# Altium schematic symbol library Analog Devices Data Converters Digital-to-Analog Converters.SchLib: 2231 symbols (part 129 of 135)
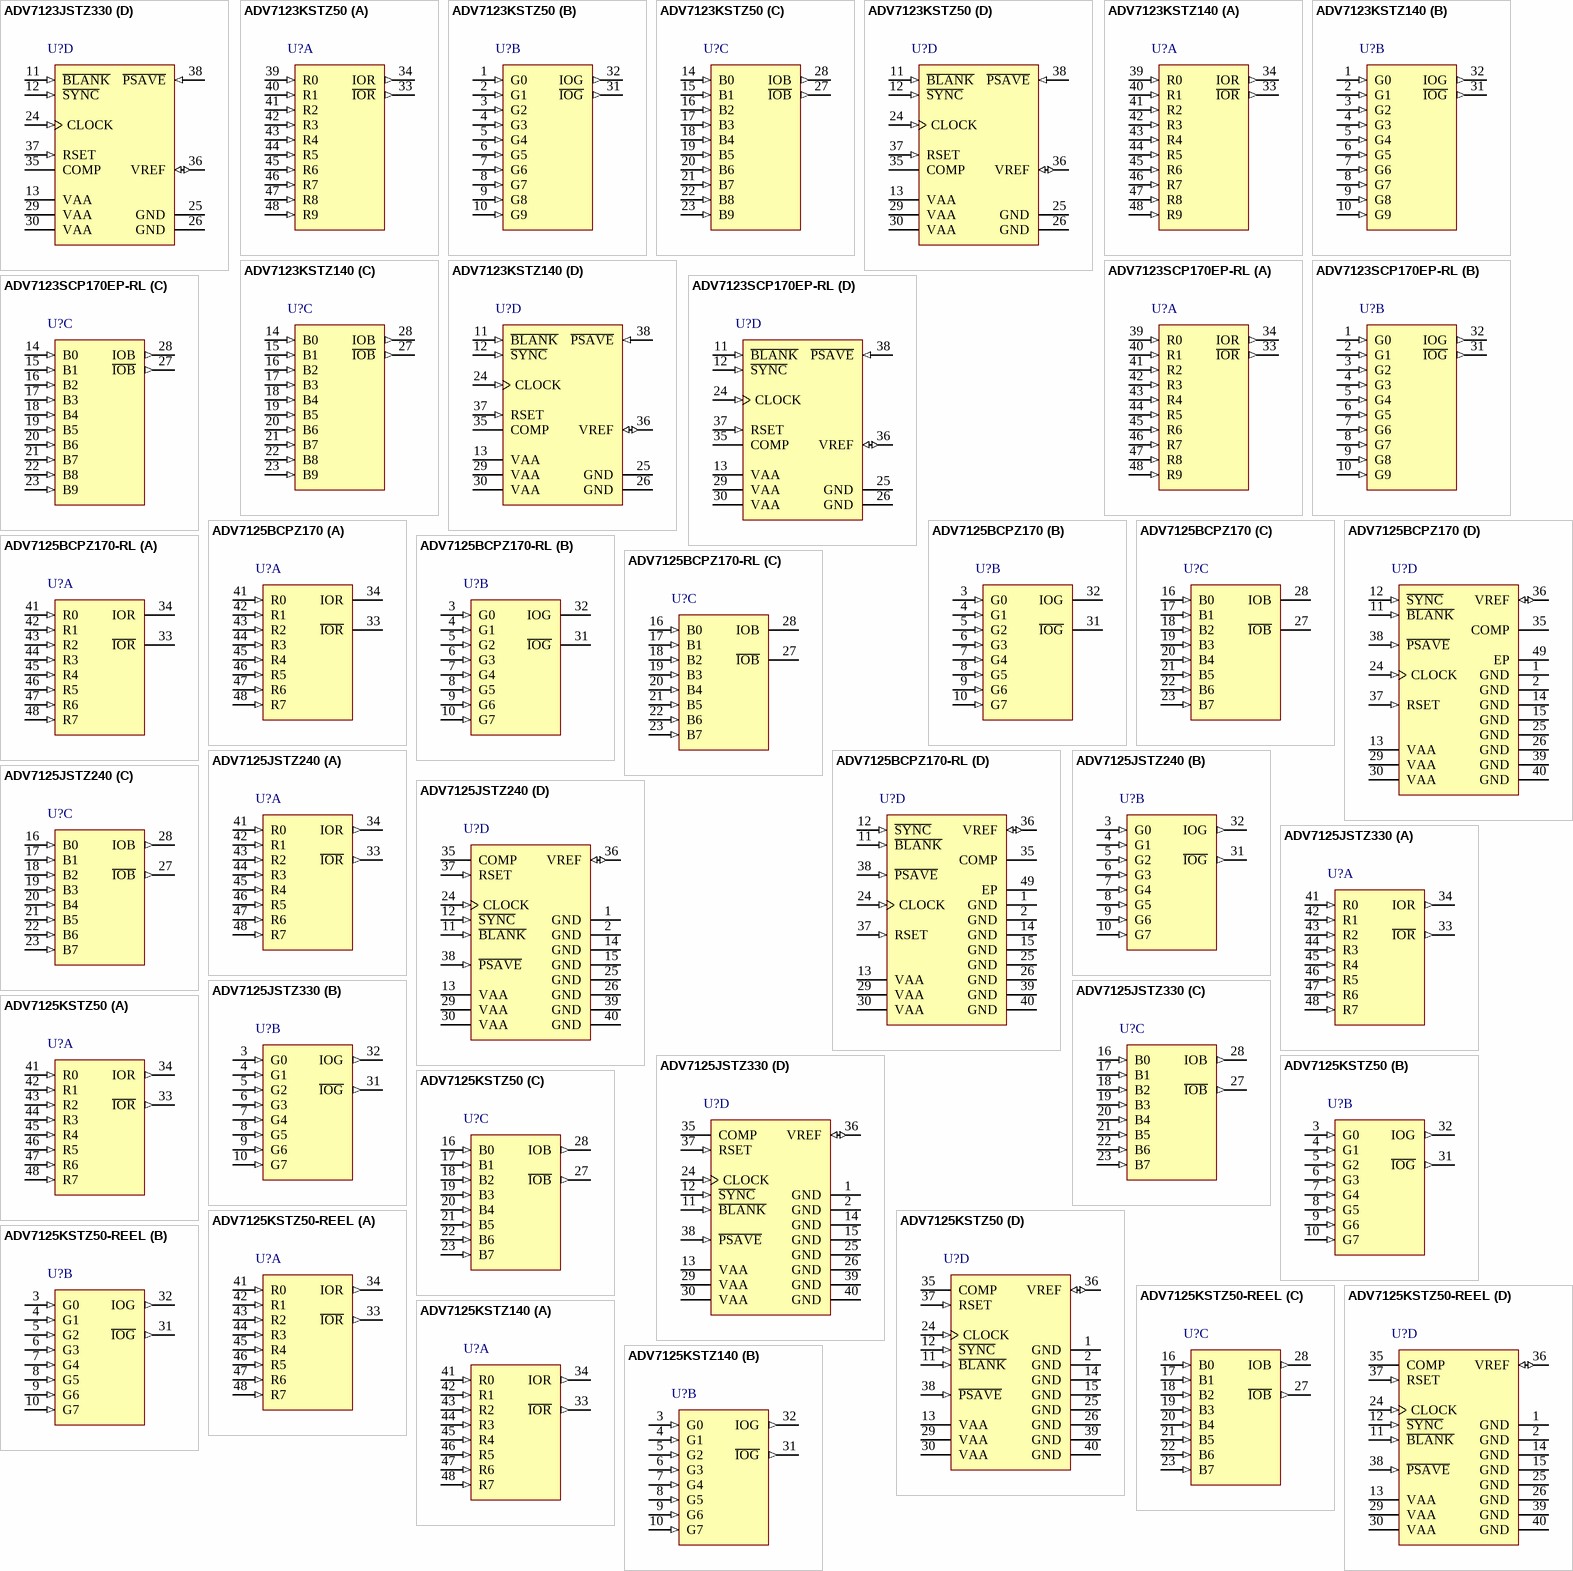
[diagram p241: symbols ADV7123JSTZ330 to ADV7125KSTZ140]

## ADV7123KSTZ50
designator U?
Triple 10-Bit CMOS 330 MHz High Speed Video Digital-to-Analog Converter, 0 to +70 degC, ST-48, Pb-Free, Tray; Generic Part Number: ADV7123; Manufacturer: Analog Devices; PartNumber: ADV7123KSTZ50; # DAC Outputs: 3; Max V+: 5.25V; Op Pwr Diss: 485mW; Resolution (Bits): 10; Settling Time: 15ns; Single Supply: Yes; DatasheetVersion: Rev.D; PackageVersion: revA; PackageReference: ST-48; PackageDescription: 48-Pin Thin Quad Flat Pack 0.5 mm Pitch; Supplier 1: Digi-Key; Supplier Part Number 1: ADV7123KSTZ50-ND; Supplier 2: Farnell; Supplier Part Number 2: 2102497; Supplier 3: Newark; Supplier Part Number 3: 94T5622; Supplier 4: Newark; Supplier Part Number 4: 19M8773; Supplier 5: Mouser; Supplier Part Number 5: 584-ADV7123KSTZ50; Packing: Tray; RoHS: Y; Mounting Technology: Surface Mount; ComponentLink1Description: Manufacturer URL; ComponentLink1URL: http://www.analog.com/en/index.html; ComponentLink2Description: Datasheet; ComponentLink2URL: http://www.analog.com/static/imported-files/data_sheets/ADV7123.pdf; ComponentLink3Description: Package Specification; ComponentLink3URL: http://www.analog.com/static/imported-files/packages/PKG_PDF/LQFP%28ST%29/ST_48.pdf; ComponentLink4Description: Product URL; ComponentLink4URL: http://www.analog.com/en/digital-to-analog-converters/da-converters/adv7123/products/product.html
footprint ST-48_N (Thin QFP, 48-Leads, Body 7x7mm, Pitch 0.5mm, IPC Medium Density)
footprint ST-48_L (Thin QFP, 48-Leads, Body 7x7mm, Pitch 0.5mm, IPC High Density)
footprint ST-48_M (Thin QFP, 48-Leads, Body 7x7mm, Pitch 0.5mm, IPC Low Density)
part A pins: 33 ~{IOR} (out) "Differential Red Current Output (High Impedance Current Sources). These RGB video outputs are specified to directly drive RS-343A and RS-170 video levels into a doubly terminated 75 ohm load. If the complementary outputs are (See Datasheet)", 34 IOR (out) "Red Current Output. These high impedance current sources are capable of directly driving a doubly terminated 75 ohm coaxial cable. All three current outputs should have similar output loads whether or not they are all being (See Datasheet)", 39 R0 (in) "Red Pixel Data Input (TTL Compatible). Pixel data is latched on the rising edge of CLOCK. R0 is the least significant data bits. Unused pixel data inputs should be connected to either the regular printed circuit board (PCB) (See Datasheet)", 40 R1 (in) "Red Pixel Data Input (TTL Compatible). Pixel data is latched on the rising edge of CLOCK. Unused pixel data inputs should be connected to either the regular printed circuit board (PCB) power or ground plane.", 41 R2 (in) "Red Pixel Data Input (TTL Compatible). Pixel data is latched on the rising edge of CLOCK. Unused pixel data inputs should be connected to either the regular printed circuit board (PCB) power or ground plane.", 42 R3 (in) "Red Pixel Data Input (TTL Compatible). Pixel data is latched on the rising edge of CLOCK. Unused pixel data inputs should be connected to either the regular printed circuit board (PCB) power or ground plane.", 43 R4 (in) "Red Pixel Data Input (TTL Compatible). Pixel data is latched on the rising edge of CLOCK. Unused pixel data inputs should be connected to either the regular printed circuit board (PCB) power or ground plane.", 44 R5 (in) "Red Pixel Data Input (TTL Compatible). Pixel data is latched on the rising edge of CLOCK. Unused pixel data inputs should be connected to either the regular printed circuit board (PCB) power or ground plane.", 45 R6 (in) "Red Pixel Data Input (TTL Compatible). Pixel data is latched on the rising edge of CLOCK. Unused pixel data inputs should be connected to either the regular printed circuit board (PCB) power or ground plane.", 46 R7 (in) "Red Pixel Data Input (TTL Compatible). Pixel data is latched on the rising edge of CLOCK. Unused pixel data inputs should be connected to either the regular printed circuit board (PCB) power or ground plane.", 47 R8 (in) "Red Pixel Data Input (TTL Compatible). Pixel data is latched on the rising edge of CLOCK. Unused pixel data inputs should be connected to either the regular printed circuit board (PCB) power or ground plane.", 48 R9 (in) "Red Pixel Data Input (TTL Compatible). Pixel data is latched on the rising edge of CLOCK. Unused pixel data inputs should be connected to either the regular printed circuit board (PCB) power or ground plane."
part B pins: 1 G0 (in) "Green Pixel Data Input (TTL Compatible). Pixel data is latched on the rising edge of CLOCK. G0 is the least significant data bits. Unused pixel data inputs should be connected to either the regular printed circuit board (See Datasheet)", 2 G1 (in) "Green Pixel Data Input (TTL Compatible). Pixel data is latched on the rising edge of CLOCK.  Unused pixel data inputs should be connected to either the regular printed circuit board (PCB) power or ground plane.", 3 G2 (in) "Green Pixel Data Input (TTL Compatible). Pixel data is latched on the rising edge of CLOCK.  Unused pixel data inputs should be connected to either the regular printed circuit board (PCB) power or ground plane.", 4 G3 (in) "Green Pixel Data Input (TTL Compatible). Pixel data is latched on the rising edge of CLOCK.  Unused pixel data inputs should be connected to either the regular printed circuit board (PCB) power or ground plane.", 5 G4 (in) "Green Pixel Data Input (TTL Compatible). Pixel data is latched on the rising edge of CLOCK.  Unused pixel data inputs should be connected to either the regular printed circuit board (PCB) power or ground plane.", 6 G5 (in) "Green Pixel Data Input (TTL Compatible). Pixel data is latched on the rising edge of CLOCK.  Unused pixel data inputs should be connected to either the regular printed circuit board (PCB) power or ground plane.", 7 G6 (in) "Green Pixel Data Input (TTL Compatible). Pixel data is latched on the rising edge of CLOCK.  Unused pixel data inputs should be connected to either the regular printed circuit board (PCB) power or ground plane.", 8 G7 (in) "Green Pixel Data Input (TTL Compatible). Pixel data is latched on the rising edge of CLOCK.  Unused pixel data inputs should be connected to either the regular printed circuit board (PCB) power or ground plane.", 9 G8 (in) "Green Pixel Data Input (TTL Compatible). Pixel data is latched on the rising edge of CLOCK.  Unused pixel data inputs should be connected to either the regular printed circuit board (PCB) power or ground plane.", 10 G9 (in) "Green Pixel Data Input (TTL Compatible). Pixel data is latched on the rising edge of CLOCK.  Unused pixel data inputs should be connected to either the regular printed circuit board (PCB) power or ground plane.", 31 ~{IOG} (out) "Differential Green Current Output (High Impedance Current Sources). These RGB video outputs are specified to directly drive RS-343A and RS-170 video levels into a doubly terminated 75 ohm load. If the complementary outputs (See Datasheet)", 32 IOG (out) "Green Current Output. These high impedance current sources are capable of directly driving a doubly terminated 75 ohm coaxial cable. All three current outputs should have similar output loads whether or not they are all (See Datasheet)"
part C pins: 14 B0 (in) "Blue Pixel Data Input (TTL Compatible). Pixel data is latched on the rising edge of CLOCK. B0 is the least significant data bits. Unused pixel data inputs should be connected to either the regular printed circuit board (PCB) (See Datasheet)", 15 B1 (in) "Blue Pixel Data Input (TTL Compatible). Pixel data is latched on the rising edge of CLOCK.  Unused pixel data inputs should be connected to either the regular printed circuit board (PCB) power or ground plane.", 16 B2 (in) "Blue Pixel Data Input (TTL Compatible). Pixel data is latched on the rising edge of CLOCK.  Unused pixel data inputs should be connected to either the regular printed circuit board (PCB) power or ground plane.", 17 B3 (in) "Blue Pixel Data Input (TTL Compatible). Pixel data is latched on the rising edge of CLOCK.  Unused pixel data inputs should be connected to either the regular printed circuit board (PCB) power or ground plane.", 18 B4 (in) "Blue Pixel Data Input (TTL Compatible). Pixel data is latched on the rising edge of CLOCK.  Unused pixel data inputs should be connected to either the regular printed circuit board (PCB) power or ground plane.", 19 B5 (in) "Blue Pixel Data Input (TTL Compatible). Pixel data is latched on the rising edge of CLOCK.  Unused pixel data inputs should be connected to either the regular printed circuit board (PCB) power or ground plane.", 20 B6 (in) "Blue Pixel Data Input (TTL Compatible). Pixel data is latched on the rising edge of CLOCK.  Unused pixel data inputs should be connected to either the regular printed circuit board (PCB) power or ground plane.", 21 B7 (in) "Blue Pixel Data Input (TTL Compatible). Pixel data is latched on the rising edge of CLOCK.  Unused pixel data inputs should be connected to either the regular printed circuit board (PCB) power or ground plane.", 22 B8 (in) "Blue Pixel Data Input (TTL Compatible). Pixel data is latched on the rising edge of CLOCK.  Unused pixel data inputs should be connected to either the regular printed circuit board (PCB) power or ground plane.", 23 B9 (in) "Blue Pixel Data Input (TTL Compatible). Pixel data is latched on the rising edge of CLOCK.  Unused pixel data inputs should be connected to either the regular printed circuit board (PCB) power or ground plane.", 27 ~{IOB} (out) "Differential Blue Current Output (High Impedance Current Sources). These RGB video outputs are specified to directly drive RS-343A and RS-170 video levels into a doubly terminated 75 ohm load. If the complementary outputs (See Datasheet)", 28 IOB (out) "Blue Current Output. These high impedance current sources are capable of directly driving a doubly terminated 75 ohm coaxial cable. All three current outputs should have similar output loads whether or not they are all being (See Datasheet)"
part D pins: 11 ~{BLANK} (in) "Composite Blank Control Input (TTL Compatible). A Logic 0 on this control input drives the analog outputs, IOR, IOB, and IOG, to the blanking level. The B\L\A\N\K\ signal is latched on the rising edge of CLOCK. While (See Datasheet)", 12 ~{SYNC} (in) "Composite Sync Control Input (TTL Compatible). A Logic 0 on the S\Y\N\C\ input switches off a 40 IRE current source. This is internally connected to the IOG analog output. S\Y\N\C\ does not override any other control or data (See Datasheet)", 13 VAA (power) "Analog Power Supply (5 V +/- 5%). All VAA pins on the ADV7123 must be connected.", 24 CLOCK (in) "Clock Input (TTL Compatible). The rising edge of CLOCK latches the R0 to R9, G0 to G9, B0 to B9, S\Y\N\C\, and B\L\A\N\K\ pixel and control inputs. It is typically the pixel clock rate of the video system. CLOCK should be (See Datasheet)", 25 GND (power) "Ground. All GND pins must be connected.", 26 GND (power) "Ground. All GND pins must be connected.", 29 VAA (power) "Analog Power Supply (5 V +/- 5%). All VAA pins on the ADV7123 must be connected.", 30 VAA (power) "Analog Power Supply (5 V +/- 5%). All VAA pins on the ADV7123 must be connected.", 35 COMP "Compensation Pin. This is a compensation pin for the internal reference amplifier. A 0.1 uF ceramic capacitor must be connected between COMP and VAA.", 36 VREF (io) "Voltage Reference Input for DACs or Voltage Reference Output (1.235 V).", 37 RSET (in) "A resistor (RSET) connected between this pin and GND controls the magnitude of the full-scale video signal. Note that the IRE relationships are maintained, regardless of the full-scale output current. For nominal video (See Datasheet)", 38 ~{PSAVE} (in) "Power Save Control Pin. Reduced power consumption is available on the ADV7123 when this pin is active."

## ADV7123KSTZ140
designator U?
3 Channel 10-Bit CMOS High Speed Video Digital-to-Analog Converter, 330 MHz, 0 to +70 degC, ST-48, Pb-Free, Tray; Generic Part Number: ADV7123; Manufacturer: Analog Devices; PartNumber: ADV7123KSTZ140; # DAC Outputs: 3; Max V+: 5.25V; Op Pwr Diss: 485mW; Resolution (Bits): 10; Settling Time: 15ns; Single Supply: Yes; DatasheetVersion: Rev.D; PackageVersion: revA; PackageReference: ST-48; PackageDescription: 48-Pin Thin Quad Flat Pack 0.5 mm Pitch; Supplier 1: Digi-Key; Supplier Part Number 1: ADV7123KSTZ140-ND; Supplier 2: Farnell; Supplier Part Number 2: 2102496; Supplier 3: Newark; Supplier Part Number 3: 94T5621; Supplier 4: Newark; Supplier Part Number 4: 19M8772; Supplier 5: Mouser; Supplier Part Number 5: 584-ADV7123KSTZ140; Packing: Tray; RoHS: Y; Mounting Technology: Surface Mount; ComponentLink1Description: Manufacturer URL; ComponentLink1URL: http://www.analog.com/en/index.html; ComponentLink2Description: Datasheet; ComponentLink2URL: http://www.analog.com/static/imported-files/data_sheets/ADV7123.pdf; ComponentLink3Description: Package Specification; ComponentLink3URL: http://www.analog.com/static/imported-files/packages/PKG_PDF/LQFP%28ST%29/ST_48.pdf; ComponentLink4Description: Product URL; ComponentLink4URL: http://www.analog.com/en/digital-to-analog-converters/da-converters/adv7123/products/product.html
footprint ST-48_N (Thin QFP, 48-Leads, Body 7x7mm, Pitch 0.5mm, IPC Medium Density)
footprint ST-48_L (Thin QFP, 48-Leads, Body 7x7mm, Pitch 0.5mm, IPC High Density)
footprint ST-48_M (Thin QFP, 48-Leads, Body 7x7mm, Pitch 0.5mm, IPC Low Density)
part A pins: 33 ~{IOR} (out) "Differential Red Current Output (High Impedance Current Sources). These RGB video outputs are specified to directly drive RS-343A and RS-170 video levels into a doubly terminated 75 ohm load. If the complementary outputs are (See Datasheet)", 34 IOR (out) "Red Current Output. These high impedance current sources are capable of directly driving a doubly terminated 75 ohm coaxial cable. All three current outputs should have similar output loads whether or not they are all being (See Datasheet)", 39 R0 (in) "Red Pixel Data Input (TTL Compatible). Pixel data is latched on the rising edge of CLOCK. R0 is the least significant data bits. Unused pixel data inputs should be connected to either the regular printed circuit board (PCB) (See Datasheet)", 40 R1 (in) "Red Pixel Data Input (TTL Compatible). Pixel data is latched on the rising edge of CLOCK. Unused pixel data inputs should be connected to either the regular printed circuit board (PCB) power or ground plane.", 41 R2 (in) "Red Pixel Data Input (TTL Compatible). Pixel data is latched on the rising edge of CLOCK. Unused pixel data inputs should be connected to either the regular printed circuit board (PCB) power or ground plane.", 42 R3 (in) "Red Pixel Data Input (TTL Compatible). Pixel data is latched on the rising edge of CLOCK. Unused pixel data inputs should be connected to either the regular printed circuit board (PCB) power or ground plane.", 43 R4 (in) "Red Pixel Data Input (TTL Compatible). Pixel data is latched on the rising edge of CLOCK. Unused pixel data inputs should be connected to either the regular printed circuit board (PCB) power or ground plane.", 44 R5 (in) "Red Pixel Data Input (TTL Compatible). Pixel data is latched on the rising edge of CLOCK. Unused pixel data inputs should be connected to either the regular printed circuit board (PCB) power or ground plane.", 45 R6 (in) "Red Pixel Data Input (TTL Compatible). Pixel data is latched on the rising edge of CLOCK. Unused pixel data inputs should be connected to either the regular printed circuit board (PCB) power or ground plane.", 46 R7 (in) "Red Pixel Data Input (TTL Compatible). Pixel data is latched on the rising edge of CLOCK. Unused pixel data inputs should be connected to either the regular printed circuit board (PCB) power or ground plane.", 47 R8 (in) "Red Pixel Data Input (TTL Compatible). Pixel data is latched on the rising edge of CLOCK. Unused pixel data inputs should be connected to either the regular printed circuit board (PCB) power or ground plane.", 48 R9 (in) "Red Pixel Data Input (TTL Compatible). Pixel data is latched on the rising edge of CLOCK. Unused pixel data inputs should be connected to either the regular printed circuit board (PCB) power or ground plane."
part B pins: 1 G0 (in) "Green Pixel Data Input (TTL Compatible). Pixel data is latched on the rising edge of CLOCK. G0 is the least significant data bits. Unused pixel data inputs should be connected to either the regular printed circuit board (See Datasheet)", 2 G1 (in) "Green Pixel Data Input (TTL Compatible). Pixel data is latched on the rising edge of CLOCK.  Unused pixel data inputs should be connected to either the regular printed circuit board (PCB) power or ground plane.", 3 G2 (in) "Green Pixel Data Input (TTL Compatible). Pixel data is latched on the rising edge of CLOCK.  Unused pixel data inputs should be connected to either the regular printed circuit board (PCB) power or ground plane.", 4 G3 (in) "Green Pixel Data Input (TTL Compatible). Pixel data is latched on the rising edge of CLOCK.  Unused pixel data inputs should be connected to either the regular printed circuit board (PCB) power or ground plane.", 5 G4 (in) "Green Pixel Data Input (TTL Compatible). Pixel data is latched on the rising edge of CLOCK.  Unused pixel data inputs should be connected to either the regular printed circuit board (PCB) power or ground plane.", 6 G5 (in) "Green Pixel Data Input (TTL Compatible). Pixel data is latched on the rising edge of CLOCK.  Unused pixel data inputs should be connected to either the regular printed circuit board (PCB) power or ground plane.", 7 G6 (in) "Green Pixel Data Input (TTL Compatible). Pixel data is latched on the rising edge of CLOCK.  Unused pixel data inputs should be connected to either the regular printed circuit board (PCB) power or ground plane.", 8 G7 (in) "Green Pixel Data Input (TTL Compatible). Pixel data is latched on the rising edge of CLOCK.  Unused pixel data inputs should be connected to either the regular printed circuit board (PCB) power or ground plane.", 9 G8 (in) "Green Pixel Data Input (TTL Compatible). Pixel data is latched on the rising edge of CLOCK.  Unused pixel data inputs should be connected to either the regular printed circuit board (PCB) power or ground plane.", 10 G9 (in) "Green Pixel Data Input (TTL Compatible). Pixel data is latched on the rising edge of CLOCK.  Unused pixel data inputs should be connected to either the regular printed circuit board (PCB) power or ground plane.", 31 ~{IOG} (out) "Differential Green Current Output (High Impedance Current Sources). These RGB video outputs are specified to directly drive RS-343A and RS-170 video levels into a doubly terminated 75 ohm load. If the complementary outputs (See Datasheet)", 32 IOG (out) "Green Current Output. These high impedance current sources are capable of directly driving a doubly terminated 75 ohm coaxial cable. All three current outputs should have similar output loads whether or not they are all (See Datasheet)"
part C pins: 14 B0 (in) "Blue Pixel Data Input (TTL Compatible). Pixel data is latched on the rising edge of CLOCK. B0 is the least significant data bits. Unused pixel data inputs should be connected to either the regular printed circuit board (PCB) (See Datasheet)", 15 B1 (in) "Blue Pixel Data Input (TTL Compatible). Pixel data is latched on the rising edge of CLOCK.  Unused pixel data inputs should be connected to either the regular printed circuit board (PCB) power or ground plane.", 16 B2 (in) "Blue Pixel Data Input (TTL Compatible). Pixel data is latched on the rising edge of CLOCK.  Unused pixel data inputs should be connected to either the regular printed circuit board (PCB) power or ground plane.", 17 B3 (in) "Blue Pixel Data Input (TTL Compatible). Pixel data is latched on the rising edge of CLOCK.  Unused pixel data inputs should be connected to either the regular printed circuit board (PCB) power or ground plane.", 18 B4 (in) "Blue Pixel Data Input (TTL Compatible). Pixel data is latched on the rising edge of CLOCK.  Unused pixel data inputs should be connected to either the regular printed circuit board (PCB) power or ground plane.", 19 B5 (in) "Blue Pixel Data Input (TTL Compatible). Pixel data is latched on the rising edge of CLOCK.  Unused pixel data inputs should be connected to either the regular printed circuit board (PCB) power or ground plane.", 20 B6 (in) "Blue Pixel Data Input (TTL Compatible). Pixel data is latched on the rising edge of CLOCK.  Unused pixel data inputs should be connected to either the regular printed circuit board (PCB) power or ground plane.", 21 B7 (in) "Blue Pixel Data Input (TTL Compatible). Pixel data is latched on the rising edge of CLOCK.  Unused pixel data inputs should be connected to either the regular printed circuit board (PCB) power or ground plane.", 22 B8 (in) "Blue Pixel Data Input (TTL Compatible). Pixel data is latched on the rising edge of CLOCK.  Unused pixel data inputs should be connected to either the regular printed circuit board (PCB) power or ground plane.", 23 B9 (in) "Blue Pixel Data Input (TTL Compatible). Pixel data is latched on the rising edge of CLOCK.  Unused pixel data inputs should be connected to either the regular printed circuit board (PCB) power or ground plane.", 27 ~{IOB} (out) "Differential Blue Current Output (High Impedance Current Sources). These RGB video outputs are specified to directly drive RS-343A and RS-170 video levels into a doubly terminated 75 ohm load. If the complementary outputs (See Datasheet)", 28 IOB (out) "Blue Current Output. These high impedance current sources are capable of directly driving a doubly terminated 75 ohm coaxial cable. All three current outputs should have similar output loads whether or not they are all being (See Datasheet)"
part D pins: 11 ~{BLANK} (in) "Composite Blank Control Input (TTL Compatible). A Logic 0 on this control input drives the analog outputs, IOR, IOB, and IOG, to the blanking level. The B\L\A\N\K\ signal is latched on the rising edge of CLOCK. While (See Datasheet)", 12 ~{SYNC} (in) "Composite Sync Control Input (TTL Compatible). A Logic 0 on the S\Y\N\C\ input switches off a 40 IRE current source. This is internally connected to the IOG analog output. S\Y\N\C\ does not override any other control or data (See Datasheet)", 13 VAA (power) "Analog Power Supply (5 V +/- 5%). All VAA pins on the ADV7123 must be connected.", 24 CLOCK (in) "Clock Input (TTL Compatible). The rising edge of CLOCK latches the R0 to R9, G0 to G9, B0 to B9, S\Y\N\C\, and B\L\A\N\K\ pixel and control inputs. It is typically the pixel clock rate of the video system. CLOCK should be (See Datasheet)", 25 GND (power) "Ground. All GND pins must be connected.", 26 GND (power) "Ground. All GND pins must be connected.", 29 VAA (power) "Analog Power Supply (5 V +/- 5%). All VAA pins on the ADV7123 must be connected.", 30 VAA (power) "Analog Power Supply (5 V +/- 5%). All VAA pins on the ADV7123 must be connected.", 35 COMP "Compensation Pin. This is a compensation pin for the internal reference amplifier. A 0.1 uF ceramic capacitor must be connected between COMP and VAA.", 36 VREF (io) "Voltage Reference Input for DACs or Voltage Reference Output (1.235 V).", 37 RSET (in) "A resistor (RSET) connected between this pin and GND controls the magnitude of the full-scale video signal. Note that the IRE relationships are maintained, regardless of the full-scale output current. For nominal video (See Datasheet)", 38 ~{PSAVE} (in) "Power Save Control Pin. Reduced power consumption is available on the ADV7123 when this pin is active."

## ADV7123SCP170EP-RL
designator U?
3 Channel 10-Bit CMOS High Speed Video Digital-to-Analog Converter, 170 MHz, -55 to +125 degC, ST-48, Reel; Generic Part Number: ADV7123; Manufacturer: Analog Devices; PartNumber: ADV7123SCP170EP-RL; # DAC Outputs: 3; Max V+: 5.25V; Op Pwr Diss: 485mW; Resolution (Bits): 10; Settling Time: 15ns; Single Supply: Yes; DatasheetVersion: Rev.0; PackageVersion: revA; PackageReference: ST-48; PackageDescription: 48-Pin Thin Quad Flat Pack 0.5 mm Pitch; Supplier 1: Digi-Key; Supplier Part Number 1: ADV7123SCP170EP-RLTR-ND; Supplier 2: Digi-Key; Supplier Part Number 2: ADV7123SCP170EP-RLCT-ND; Supplier 3: Digi-Key; Supplier Part Number 3: ADV7123SCP170EP-RLDKR-ND; Supplier 4: Newark; Supplier Part Number 4: 83R9348; Supplier 5: Mouser; Supplier Part Number 5: 584-ADV7123SCP170EPR; Packing: Reel; RoHS: N; Mounting Technology: Surface Mount; ComponentLink1Description: Manufacturer URL; ComponentLink1URL: http://www.analog.com/en/index.html; ComponentLink2Description: Datasheet; ComponentLink2URL: http://www.analog.com/static/imported-files/data_sheets/ADV7123-EP.pdf; ComponentLink3Description: Package Specification; ComponentLink3URL: http://www.analog.com/static/imported-files/packages/PKG_PDF/LQFP%28ST%29/ST_48.pdf; ComponentLink4Description: Product URL; ComponentLink4URL: http://www.analog.com/en/digital-to-analog-converters/da-converters/adv7123/products/product.html
footprint ST-48_N (Thin QFP, 48-Leads, Body 7x7mm, Pitch 0.5mm, IPC Medium Density)
footprint ST-48_L (Thin QFP, 48-Leads, Body 7x7mm, Pitch 0.5mm, IPC High Density)
footprint ST-48_M (Thin QFP, 48-Leads, Body 7x7mm, Pitch 0.5mm, IPC Low Density)
part A pins: 33 ~{IOR} (out) "Differential Red Current Output (High Impedance Current Sources). These RGB video outputs are specified to directly drive RS-343A and RS-170 video levels into a doubly terminated 75 ohm load. If the complementary outputs are (See Datasheet)", 34 IOR (out) "Red Current Output. These high impedance current sources are capable of directly driving a doubly terminated 75 ohm coaxial cable. All three current outputs should have similar output loads whether or not they are all being (See Datasheet)", 39 R0 (in) "Red Pixel Data Input (TTL Compatible). Pixel data is latched on the rising edge of CLOCK. R0 is the least significant data bits. Unused pixel data inputs should be connected to either the regular printed circuit board (PCB) (See Datasheet)", 40 R1 (in) "Red Pixel Data Input (TTL Compatible). Pixel data is latched on the rising edge of CLOCK. Unused pixel data inputs should be connected to either the regular printed circuit board (PCB) power or ground plane.", 41 R2 (in) "Red Pixel Data Input (TTL Compatible). Pixel data is latched on the rising edge of CLOCK. Unused pixel data inputs should be connected to either the regular printed circuit board (PCB) power or ground plane.", 42 R3 (in) "Red Pixel Data Input (TTL Compatible). Pixel data is latched on the rising edge of CLOCK. Unused pixel data inputs should be connected to either the regular printed circuit board (PCB) power or ground plane.", 43 R4 (in) "Red Pixel Data Input (TTL Compatible). Pixel data is latched on the rising edge of CLOCK. Unused pixel data inputs should be connected to either the regular printed circuit board (PCB) power or ground plane.", 44 R5 (in) "Red Pixel Data Input (TTL Compatible). Pixel data is latched on the rising edge of CLOCK. Unused pixel data inputs should be connected to either the regular printed circuit board (PCB) power or ground plane.", 45 R6 (in) "Red Pixel Data Input (TTL Compatible). Pixel data is latched on the rising edge of CLOCK. Unused pixel data inputs should be connected to either the regular printed circuit board (PCB) power or ground plane.", 46 R7 (in) "Red Pixel Data Input (TTL Compatible). Pixel data is latched on the rising edge of CLOCK. Unused pixel data inputs should be connected to either the regular printed circuit board (PCB) power or ground plane.", 47 R8 (in) "Red Pixel Data Input (TTL Compatible). Pixel data is latched on the rising edge of CLOCK. Unused pixel data inputs should be connected to either the regular printed circuit board (PCB) power or ground plane.", 48 R9 (in) "Red Pixel Data Input (TTL Compatible). Pixel data is latched on the rising edge of CLOCK. Unused pixel data inputs should be connected to either the regular printed circuit board (PCB) power or ground plane."
part B pins: 1 G0 (in) "Green Pixel Data Input (TTL Compatible). Pixel data is latched on the rising edge of CLOCK. G0 is the least significant data bits. Unused pixel data inputs should be connected to either the regular printed circuit board (See Datasheet)", 2 G1 (in) "Green Pixel Data Input (TTL Compatible). Pixel data is latched on the rising edge of CLOCK.  Unused pixel data inputs should be connected to either the regular printed circuit board (PCB) power or ground plane.", 3 G2 (in) "Green Pixel Data Input (TTL Compatible). Pixel data is latched on the rising edge of CLOCK.  Unused pixel data inputs should be connected to either the regular printed circuit board (PCB) power or ground plane.", 4 G3 (in) "Green Pixel Data Input (TTL Compatible). Pixel data is latched on the rising edge of CLOCK.  Unused pixel data inputs should be connected to either the regular printed circuit board (PCB) power or ground plane.", 5 G4 (in) "Green Pixel Data Input (TTL Compatible). Pixel data is latched on the rising edge of CLOCK.  Unused pixel data inputs should be connected to either the regular printed circuit board (PCB) power or ground plane.", 6 G5 (in) "Green Pixel Data Input (TTL Compatible). Pixel data is latched on the rising edge of CLOCK.  Unused pixel data inputs should be connected to either the regular printed circuit board (PCB) power or ground plane.", 7 G6 (in) "Green Pixel Data Input (TTL Compatible). Pixel data is latched on the rising edge of CLOCK.  Unused pixel data inputs should be connected to either the regular printed circuit board (PCB) power or ground plane.", 8 G7 (in) "Green Pixel Data Input (TTL Compatible). Pixel data is latched on the rising edge of CLOCK.  Unused pixel data inputs should be connected to either the regular printed circuit board (PCB) power or ground plane.", 9 G8 (in) "Green Pixel Data Input (TTL Compatible). Pixel data is latched on the rising edge of CLOCK.  Unused pixel data inputs should be connected to either the regular printed circuit board (PCB) power or ground plane.", 10 G9 (in) "Green Pixel Data Input (TTL Compatible). Pixel data is latched on the rising edge of CLOCK.  Unused pixel data inputs should be connected to either the regular printed circuit board (PCB) power or ground plane.", 31 ~{IOG} (out) "Differential Green Current Output (High Impedance Current Sources). These RGB video outputs are specified to directly drive RS-343A and RS-170 video levels into a doubly terminated 75 ohm load. If the complementary outputs (See Datasheet)", 32 IOG (out) "Green Current Output. These high impedance current sources are capable of directly driving a doubly terminated 75 ohm coaxial cable. All three current outputs should have similar output loads whether or not they are all (See Datasheet)"
part C pins: 14 B0 (in) "Blue Pixel Data Input (TTL Compatible). Pixel data is latched on the rising edge of CLOCK. B0 is the least significant data bits. Unused pixel data inputs should be connected to either the regular printed circuit board (PCB) (See Datasheet)", 15 B1 (in) "Blue Pixel Data Input (TTL Compatible). Pixel data is latched on the rising edge of CLOCK.  Unused pixel data inputs should be connected to either the regular printed circuit board (PCB) power or ground plane.", 16 B2 (in) "Blue Pixel Data Input (TTL Compatible). Pixel data is latched on the rising edge of CLOCK.  Unused pixel data inputs should be connected to either the regular printed circuit board (PCB) power or ground plane.", 17 B3 (in) "Blue Pixel Data Input (TTL Compatible). Pixel data is latched on the rising edge of CLOCK.  Unused pixel data inputs should be connected to either the regular printed circuit board (PCB) power or ground plane.", 18 B4 (in) "Blue Pixel Data Input (TTL Compatible). Pixel data is latched on the rising edge of CLOCK.  Unused pixel data inputs should be connected to either the regular printed circuit board (PCB) power or ground plane.", 19 B5 (in) "Blue Pixel Data Input (TTL Compatible). Pixel data is latched on the rising edge of CLOCK.  Unused pixel data inputs should be connected to either the regular printed circuit board (PCB) power or ground plane.", 20 B6 (in) "Blue Pixel Data Input (TTL Compatible). Pixel data is latched on the rising edge of CLOCK.  Unused pixel data inputs should be connected to either the regular printed circuit board (PCB) power or ground plane.", 21 B7 (in) "Blue Pixel Data Input (TTL Compatible). Pixel data is latched on the rising edge of CLOCK.  Unused pixel data inputs should be connected to either the regular printed circuit board (PCB) power or ground plane.", 22 B8 (in) "Blue Pixel Data Input (TTL Compatible). Pixel data is latched on the rising edge of CLOCK.  Unused pixel data inputs should be connected to either the regular printed circuit board (PCB) power or ground plane.", 23 B9 (in) "Blue Pixel Data Input (TTL Compatible). Pixel data is latched on the rising edge of CLOCK.  Unused pixel data inputs should be connected to either the regular printed circuit board (PCB) power or ground plane.", 27 ~{IOB} (out) "Differential Blue Current Output (High Impedance Current Sources). These RGB video outputs are specified to directly drive RS-343A and RS-170 video levels into a doubly terminated 75 ohm load. If the complementary outputs (See Datasheet)", 28 IOB (out) "Blue Current Output. These high impedance current sources are capable of directly driving a doubly terminated 75 ohm coaxial cable. All three current outputs should have similar output loads whether or not they are all being (See Datasheet)"
part D pins: 11 ~{BLANK} (in) "Composite Blank Control Input (TTL Compatible). A Logic 0 on this control input drives the analog outputs, IOR, IOB, and IOG, to the blanking level. The B\L\A\N\K\ signal is latched on the rising edge of CLOCK. While (See Datasheet)", 12 ~{SYNC} (in) "Composite Sync Control Input (TTL Compatible). A Logic 0 on the S\Y\N\C\ input switches off a 40 IRE current source. This is internally connected to the IOG analog output. S\Y\N\C\ does not override any other control or data (See Datasheet)", 13 VAA (power) "Analog Power Supply (5 V +/- 5%). All VAA pins on the ADV7123 must be connected.", 24 CLOCK (in) "Clock Input (TTL Compatible). The rising edge of CLOCK latches the R0 to R9, G0 to G9, B0 to B9, S\Y\N\C\, and B\L\A\N\K\ pixel and control inputs. It is typically the pixel clock rate of the video system. CLOCK should be (See Datasheet)", 25 GND (power) "Ground. All GND pins must be connected.", 26 GND (power) "Ground. All GND pins must be connected.", 29 VAA (power) "Analog Power Supply (5 V +/- 5%). All VAA pins on the ADV7123 must be connected.", 30 VAA (power) "Analog Power Supply (5 V +/- 5%). All VAA pins on the ADV7123 must be connected.", 35 COMP "Compensation Pin. This is a compensation pin for the internal reference amplifier. A 0.1 uF ceramic capacitor must be connected between COMP and VAA.", 36 VREF (io) "Voltage Reference Input for DACs or Voltage Reference Output (1.235 V).", 37 RSET (in) "A resistor (RSET) connected between this pin and GND controls the magnitude of the full-scale video signal. Note that the IRE relationships are maintained, regardless of the full-scale output current. For nominal video (See Datasheet)", 38 ~{PSAVE} (in) "Power Save Control Pin. Reduced power consumption is available on the ADV7123 when this pin is active."

## ADV7125BCPZ170
designator U?
3 Channel 8-Bit CMOS High Speed Video Digital-to-Analog Converter, -40 to +85 degC, CP-48-1, Pb-Free, Tray; Generic Part Number: ADV7125; Manufacturer: Analog Devices; PartNumber: ADV7125BCPZ170; # DAC Outputs: 3; Max V+: 5.25V; Op Pwr Diss: 485mW; Resolution (Bits): 8; Single Supply: No; DatasheetVersion: Rev.C; PackageVersion: Jan-2005; PackageReference: CP-48-1; PackageDescription: 48-Lead Lead Frame Chip Scale Package [LFCSP_VQ] 7 x 7 mm Body, Very Thin Quad; Supplier 1: Digi-Key; Supplier Part Number 1: ADV7125BCPZ170-ND; Supplier 2: Newark; Supplier Part Number 2: 85R6422; Supplier 3: Mouser; Supplier Part Number 3: 584-ADV7125BCPZ170; Packing: Tray; RoHS: Y; Mounting Technology: Surface Mount; Code_JEDEC: MO-220-VKKD-2; ComponentLink1Description: Manufacturer URL; ComponentLink1URL: http://www.analog.com/en/index.html; ComponentLink2Description: Datasheet; ComponentLink2URL: http://www.analog.com/static/imported-files/data_sheets/ADV7125.pdf; ComponentLink3Description: Package Specification; ComponentLink3URL: http://www.analog.com/static/imported-files/packages/PKG_PDF/LFCSP(CP)/CP-48/CP_48_1.pdf; ComponentLink4Description: Product URL; ComponentLink4URL: http://www.analog.com/en/digital-to-analog-converters/da-converters/adv7125/products/product.html
footprint CP-48-1_N (QFN, 48-Leads, Body 7x7mm, Pitch 0.5mm, Thermal Pad 5.1x5.1mm, IPC Medium Density)
footprint CP-48-1_L (QFN, 48-Leads, Body 7x7mm, Pitch 0.5mm, Thermal Pad 5.1x5.1mm, IPC High Density)
footprint CP-48-1_M (QFN, 48-Leads, Body 7x7mm, Pitch 0.5mm, Thermal Pad 5.1x5.1mm, IPC Low Density)
part A pins: 33 ~{IOR} (hiz) "Differential Red, Green, and Blue Current Outputs (High Impedance Current Sources). These RGB video outputs are specified to directly drive RS-343A and RS-170 video levels into a doubly terminated 75 ohm load. If the (See Datasheet)", 34 IOR (hiz) "Red, Green, and Blue Current Outputs. These high impedance current sources are capable of directly driving a doubly terminated 75 O coaxial cable. All three current outputs should have similar output loads whether or not (See Datasheet)", 41 R0 (in) "Red, Green, and Blue Pixel Data Inputs (TTL Compatible). Pixel data is latched on the rising edge of CLOCK. R0, G0, and B0 are the least significant data bits. Unused pixel data inputs should be connected to either the (See Datasheet)", 42 R1 (in) "Red, Green, and Blue Pixel Data Inputs (TTL Compatible). Pixel data is latched on the rising edge of CLOCK. R0, G0, and B0 are the least significant data bits. Unused pixel data inputs should be connected to either the (See Datasheet)", 43 R2 (in) "Red, Green, and Blue Pixel Data Inputs (TTL Compatible). Pixel data is latched on the rising edge of CLOCK. R0, G0, and B0 are the least significant data bits. Unused pixel data inputs should be connected to either the (See Datasheet)", 44 R3 (in) "Red, Green, and Blue Pixel Data Inputs (TTL Compatible). Pixel data is latched on the rising edge of CLOCK. R0, G0, and B0 are the least significant data bits. Unused pixel data inputs should be connected to either the (See Datasheet)", 45 R4 (in) "Red, Green, and Blue Pixel Data Inputs (TTL Compatible). Pixel data is latched on the rising edge of CLOCK. R0, G0, and B0 are the least significant data bits. Unused pixel data inputs should be connected to either the (See Datasheet)", 46 R5 (in) "Red, Green, and Blue Pixel Data Inputs (TTL Compatible). Pixel data is latched on the rising edge of CLOCK. R0, G0, and B0 are the least significant data bits. Unused pixel data inputs should be connected to either the (See Datasheet)", 47 R6 (in) "Red, Green, and Blue Pixel Data Inputs (TTL Compatible). Pixel data is latched on the rising edge of CLOCK. R0, G0, and B0 are the least significant data bits. Unused pixel data inputs should be connected to either the (See Datasheet)", 48 R7 (in) "Red, Green, and Blue Pixel Data Inputs (TTL Compatible). Pixel data is latched on the rising edge of CLOCK. R0, G0, and B0 are the least significant data bits. Unused pixel data inputs should be connected to either the (See Datasheet)"
part B pins: 3 G0 (in) "Red, Green, and Blue Pixel Data Inputs (TTL Compatible). Pixel data is latched on the rising edge of CLOCK. R0, G0, and B0 are the least significant data bits. Unused pixel data inputs should be connected to either the (See Datasheet)", 4 G1 (in) "Red, Green, and Blue Pixel Data Inputs (TTL Compatible). Pixel data is latched on the rising edge of CLOCK. R0, G0, and B0 are the least significant data bits. Unused pixel data inputs should be connected to either the (See Datasheet)", 5 G2 (in) "Red, Green, and Blue Pixel Data Inputs (TTL Compatible). Pixel data is latched on the rising edge of CLOCK. R0, G0, and B0 are the least significant data bits. Unused pixel data inputs should be connected to either the (See Datasheet)", 6 G3 (in) "Red, Green, and Blue Pixel Data Inputs (TTL Compatible). Pixel data is latched on the rising edge of CLOCK. R0, G0, and B0 are the least significant data bits. Unused pixel data inputs should be connected to either the (See Datasheet)", 7 G4 (in) "Red, Green, and Blue Pixel Data Inputs (TTL Compatible). Pixel data is latched on the rising edge of CLOCK. R0, G0, and B0 are the least significant data bits. Unused pixel data inputs should be connected to either the (See Datasheet)", 8 G5 (in) "Red, Green, and Blue Pixel Data Inputs (TTL Compatible). Pixel data is latched on the rising edge of CLOCK. R0, G0, and B0 are the least significant data bits. Unused pixel data inputs should be connected to either the (See Datasheet)", 9 G6 (in) "Red, Green, and Blue Pixel Data Inputs (TTL Compatible). Pixel data is latched on the rising edge of CLOCK. R0, G0, and B0 are the least significant data bits. Unused pixel data inputs should be connected to either the (See Datasheet)", 10 G7 (in) "Red, Green, and Blue Pixel Data Inputs (TTL Compatible). Pixel data is latched on the rising edge of CLOCK. R0, G0, and B0 are the least significant data bits. Unused pixel data inputs should be connected to either the (See Datasheet)", 31 ~{IOG} (hiz) "Differential Red, Green, and Blue Current Outputs (High Impedance Current Sources). These RGB video outputs are specified to directly drive RS-343A and RS-170 video levels into a doubly terminated 75 ohm load. If the (See Datasheet)", 32 IOG (hiz) "Red, Green, and Blue Current Outputs. These high impedance current sources are capable of directly driving a doubly terminated 75 O coaxial cable. All three current outputs should have similar output loads whether or not (See Datasheet)"
part C pins: 16 B0 (in) "Red, Green, and Blue Pixel Data Inputs (TTL Compatible). Pixel data is latched on the rising edge of CLOCK. R0, G0, and B0 are the least significant data bits. Unused pixel data inputs should be connected to either the (See Datasheet)", 17 B1 (in) "Red, Green, and Blue Pixel Data Inputs (TTL Compatible). Pixel data is latched on the rising edge of CLOCK. R0, G0, and B0 are the least significant data bits. Unused pixel data inputs should be connected to either the (See Datasheet)", 18 B2 (in) "Red, Green, and Blue Pixel Data Inputs (TTL Compatible). Pixel data is latched on the rising edge of CLOCK. R0, G0, and B0 are the least significant data bits. Unused pixel data inputs should be connected to either the (See Datasheet)", 19 B3 (in) "Red, Green, and Blue Pixel Data Inputs (TTL Compatible). Pixel data is latched on the rising edge of CLOCK. R0, G0, and B0 are the least significant data bits. Unused pixel data inputs should be connected to either the (See Datasheet)", 20 B4 (in) "Red, Green, and Blue Pixel Data Inputs (TTL Compatible). Pixel data is latched on the rising edge of CLOCK. R0, G0, and B0 are the least significant data bits. Unused pixel data inputs should be connected to either the (See Datasheet)", 21 B5 (in) "Red, Green, and Blue Pixel Data Inputs (TTL Compatible). Pixel data is latched on the rising edge of CLOCK. R0, G0, and B0 are the least significant data bits. Unused pixel data inputs should be connected to either the (See Datasheet)", 22 B6 (in) "Red, Green, and Blue Pixel Data Inputs (TTL Compatible). Pixel data is latched on the rising edge of CLOCK. R0, G0, and B0 are the least significant data bits. Unused pixel data inputs should be connected to either the (See Datasheet)", 23 B7 (in) "Red, Green, and Blue Pixel Data Inputs (TTL Compatible). Pixel data is latched on the rising edge of CLOCK. R0, G0, and B0 are the least significant data bits. Unused pixel data inputs should be connected to either the (See Datasheet)", 27 ~{IOB} (hiz) "Differential Red, Green, and Blue Current Outputs (High Impedance Current Sources). These RGB video outputs are specified to directly drive RS-343A and RS-170 video levels into a doubly terminated 75 ohm load. If the (See Datasheet)", 28 IOB (hiz) "Red, Green, and Blue Current Outputs. These high impedance current sources are capable of directly driving a doubly terminated 75 O coaxial cable. All three current outputs should have similar output loads whether or not (See Datasheet)"
part D pins: 1 GND (power) "Ground. All GND pins must be connected.", 2 GND (power) "Ground. All GND pins must be connected.", 11 ~{BLANK} (in) "Composite Blank Control Input (TTL Compatible). A Logic 0 on this control input drives the analog outputs, IOR, IOB, and IOG, to the blanking level. The B\L\A\N\K\ signal is latched on the rising edge of CLOCK. While (See Datasheet)", 12 ~{SYNC} (in) "Composite Sync Control Input (TTL Compatible). A Logic 0 on the S\Y\N\C\ input switches off a  40 IRE current source. This is internally connected to the IOG analog output. S\Y\N\C\ does not override any other control or (See Datasheet)", 13 VAA (power) "Analog Power Supply (5 V +/- 5%). All VAA pins on the ADV7125 must be connected.", 14 GND (power) "Ground. All GND pins must be connected.", 15 GND (power) "Ground. All GND pins must be connected.", 24 CLOCK (in) "Clock Input (TTL Compatible). The rising edge of CLOCK latches the R0 to R7, G0 to G7, B0 to B7, S\Y\N\C\, and B\L\A\N\K\ pixel and control inputs. It is typically the pixel clock rate of the video system. CLOCK should be (See Datasheet)", 25 GND (power) "Ground. All GND pins must be connected.", 26 GND (power) "Ground. All GND pins must be connected.", 29 VAA (power) "Analog Power Supply (5 V +/- 5%). All VAA pins on the ADV7125 must be connected.", 30 VAA (power) "Analog Power Supply (5 V +/- 5%). All VAA pins on the ADV7125 must be connected.", 35 COMP "Compensation Pin. This is a compensation pin for the internal reference amplifier. A 0.1 uF ceramic capacitor must be connected between COMP and VAA.", 36 VREF (io) "Voltage Reference Input for DACs or Voltage Reference Output (1.235 V).", 37 RSET (in) "A resistor (RSET) connected between this pin and GND controls the magnitude of the full-scale video signal. Note that the IRE relationships are maintained, regardless of the full-scale output current. The RSET (ohm) = 11,445 (See Datasheet)", 38 ~{PSAVE} (in) "Power Save Control Pin. Reduced power consumption is available on the ADV7125 when this pin is active.", 39 GND (power) "Ground. All GND pins must be connected.", 40 GND (power) "Ground. All GND pins must be connected.", 49 EP (power) "The LFCSP_VQ has an exposed paddle that must be connected to GND."